# Altium schematic symbol library SparkFun-Aesthetics.SCHLIB: 129 symbols
Pins are listed as number, name and electrical type; pins without a type are passive.

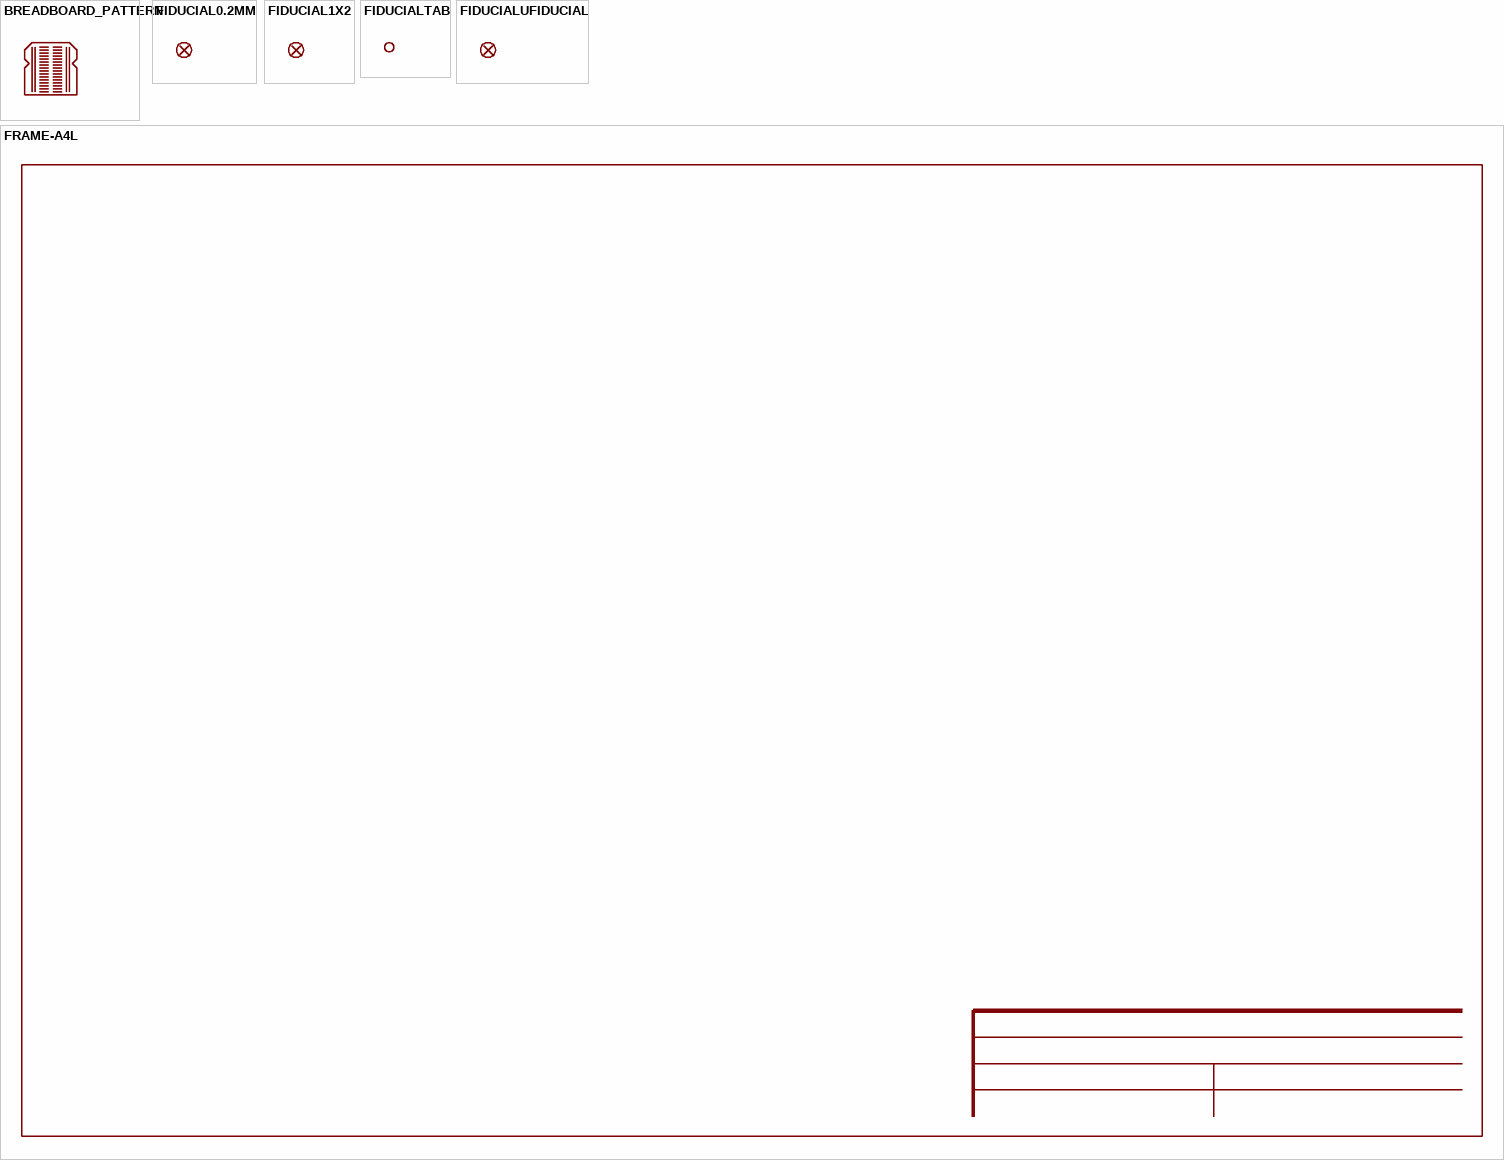
[diagram p0: symbols BREADBOARD_PATTERN to FRAME-A4L]

## BREADBOARD_PATTERN
designator LOGO?, comment Breadboard-Spacing Reference    tDoc reference markings that correspond to solderless breadboard row spacing. Includes power rails and void space between rows.  (value not drawn)
GateName_1: G$1; SymbolName_1: BREADBOARD_ROWS; DeviceSetName: BREADBOARD_PATTERN; LibraryName: SparkFun-Aesthetics; Package: BREADBOARD_SPACING
footprint BREADBOARD_SPACING

## FIDUCIAL0.2MM
designator FD?, comment Fiducial Alignment Points    Point-of-reference for pick-and-place machines and other optical instruments.  (value not drawn)
GateName_1: G$1; DeviceName: 0.2MM; SymbolName_1: FIDUCIAL; LibraryName: SparkFun-Aesthetics; DeviceSetName: FIDUCIAL; Package: FIDUCIAL-0.2MM
footprint FIDUCIAL-0.2MM

## FIDUCIAL1X2
designator FD?, comment Fiducial Alignment Points    Point-of-reference for pick-and-place machines and other optical instruments.  (value not drawn)
GateName_1: G$1; DeviceName: 1X2; SymbolName_1: FIDUCIAL; LibraryName: SparkFun-Aesthetics; DeviceSetName: FIDUCIAL; Package: FIDUCIAL-1X2
footprint FIDUCIAL-1X2

## FIDUCIALTAB
designator FD?, comment Fiducial Panel Tab    This is half of a tab, with fiducial reference mark, used to connect individual boards in a panel of PCBs.   Two of these half tabs, rotated in opposite directions, can be connected together to form a full tab, with two fiducial markings. Place along the edge of a panel of PCBs, this will allow for panels with boards not connected by v-scores, which allows for easier depanelization where there are overhanging components. It can also be used for designs too small to accomodate fiducial marks on individual boards.  (value not drawn)
GateName_1: G$1; SymbolName_1: FIDUCIALTAB; LibraryName: SparkFun-Aesthetics; DeviceSetName: FIDUCIALTAB; Package: FIDUCIALTAB
footprint FIDUCIALTAB

## FIDUCIALUFIDUCIAL
designator FD?, comment Fiducial Alignment Points    Point-of-reference for pick-and-place machines and other optical instruments.  (value not drawn)
GateName_1: G$1; DeviceName: UFIDUCIAL; SymbolName_1: FIDUCIAL; LibraryName: SparkFun-Aesthetics; DeviceSetName: FIDUCIAL; Package: FIDUCIAL-MICRO
footprint FIDUCIAL-MICRO

## FIO_LOGOV2
designator LOGO?, comment Funnel IO (FIO) Logo - Silkscreen    Used on the Arduino Fio.   Devices using:  FIO_LOGO  (value not drawn)
GateName_1: G$1; DeviceName: V2; SymbolName_1: FIO_LOGO; LibraryName: SparkFun-Aesthetics; DeviceSetName: FIO_LOGO; Package: FIO_LOGO
footprint FIO_LOGO

## FOUR_LAYER_WARNING
designator LOGO?, comment Four-Layer Board Warning - tDoc Layer    Warning text which will appear on both the schematic and the board file, notifying viewers that the design is a four-layer PCB.  (value not drawn)
GateName_1: G$1; SymbolName_1: FOUR_LAYER_WARNING; LibraryName: SparkFun-Aesthetics; DeviceSetName: FOUR_LAYER_WARNING; Package: FOUR_LAYER_WARNING
footprint FOUR_LAYER_WARNING

## FRAME-A4L
designator FRAME?, comment Schematic Frame - A4L - European Format    Standard A4 size frame in Landscape  (value not drawn)
GateName_1: G$1; SymbolName_1: FR-A4L; LibraryName: SparkFun-Aesthetics; DeviceSetName: FRAME-A4L

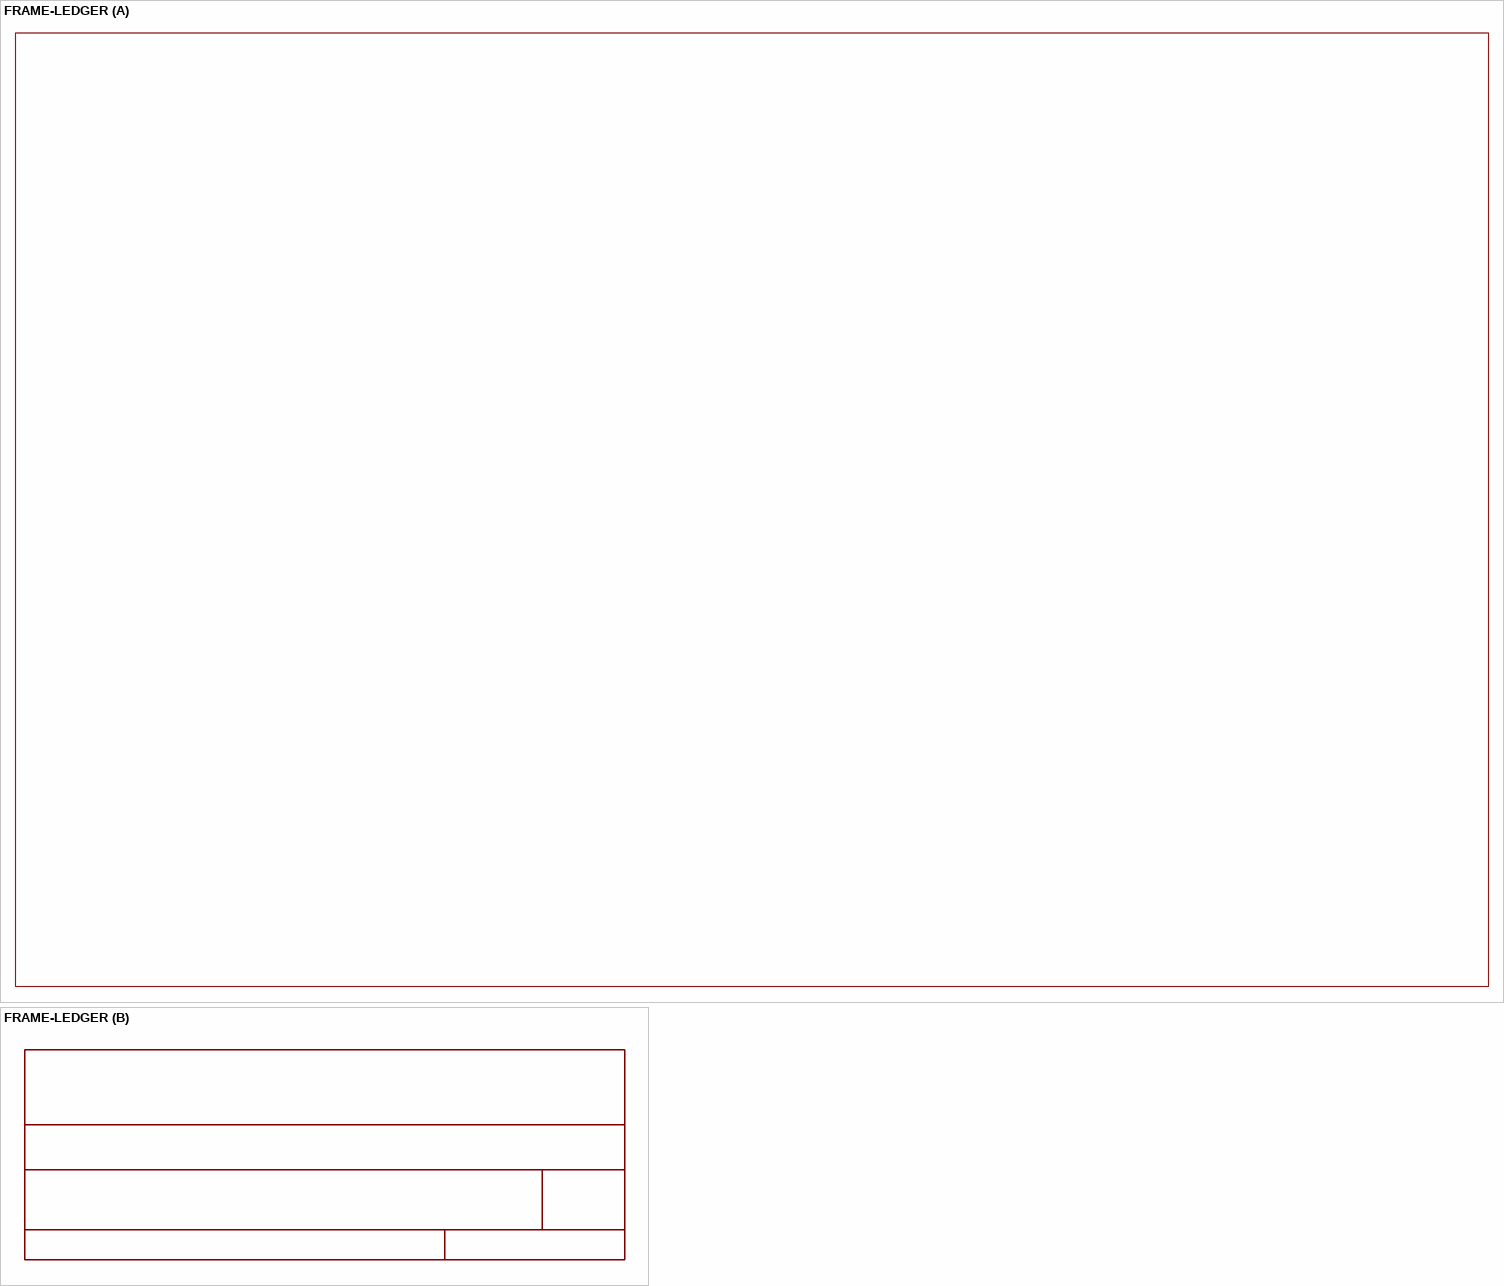
[diagram p1: symbol FRAME-LEDGER]

## FRAME-LEDGER
designator FRAME?, comment Schematic Frame - Ledger    Standard 11x14 US Ledger frame  (value not drawn)
GateName_1: G$1; SymbolName_1: FRAME_LEDGER; GateName_2: G$2; SymbolName_2: DOCFIELD; LibraryName: SparkFun-Aesthetics; DeviceSetName: FRAME-LEDGER; Package: CREATIVE_COMMONS
footprint CREATIVE_COMMONS

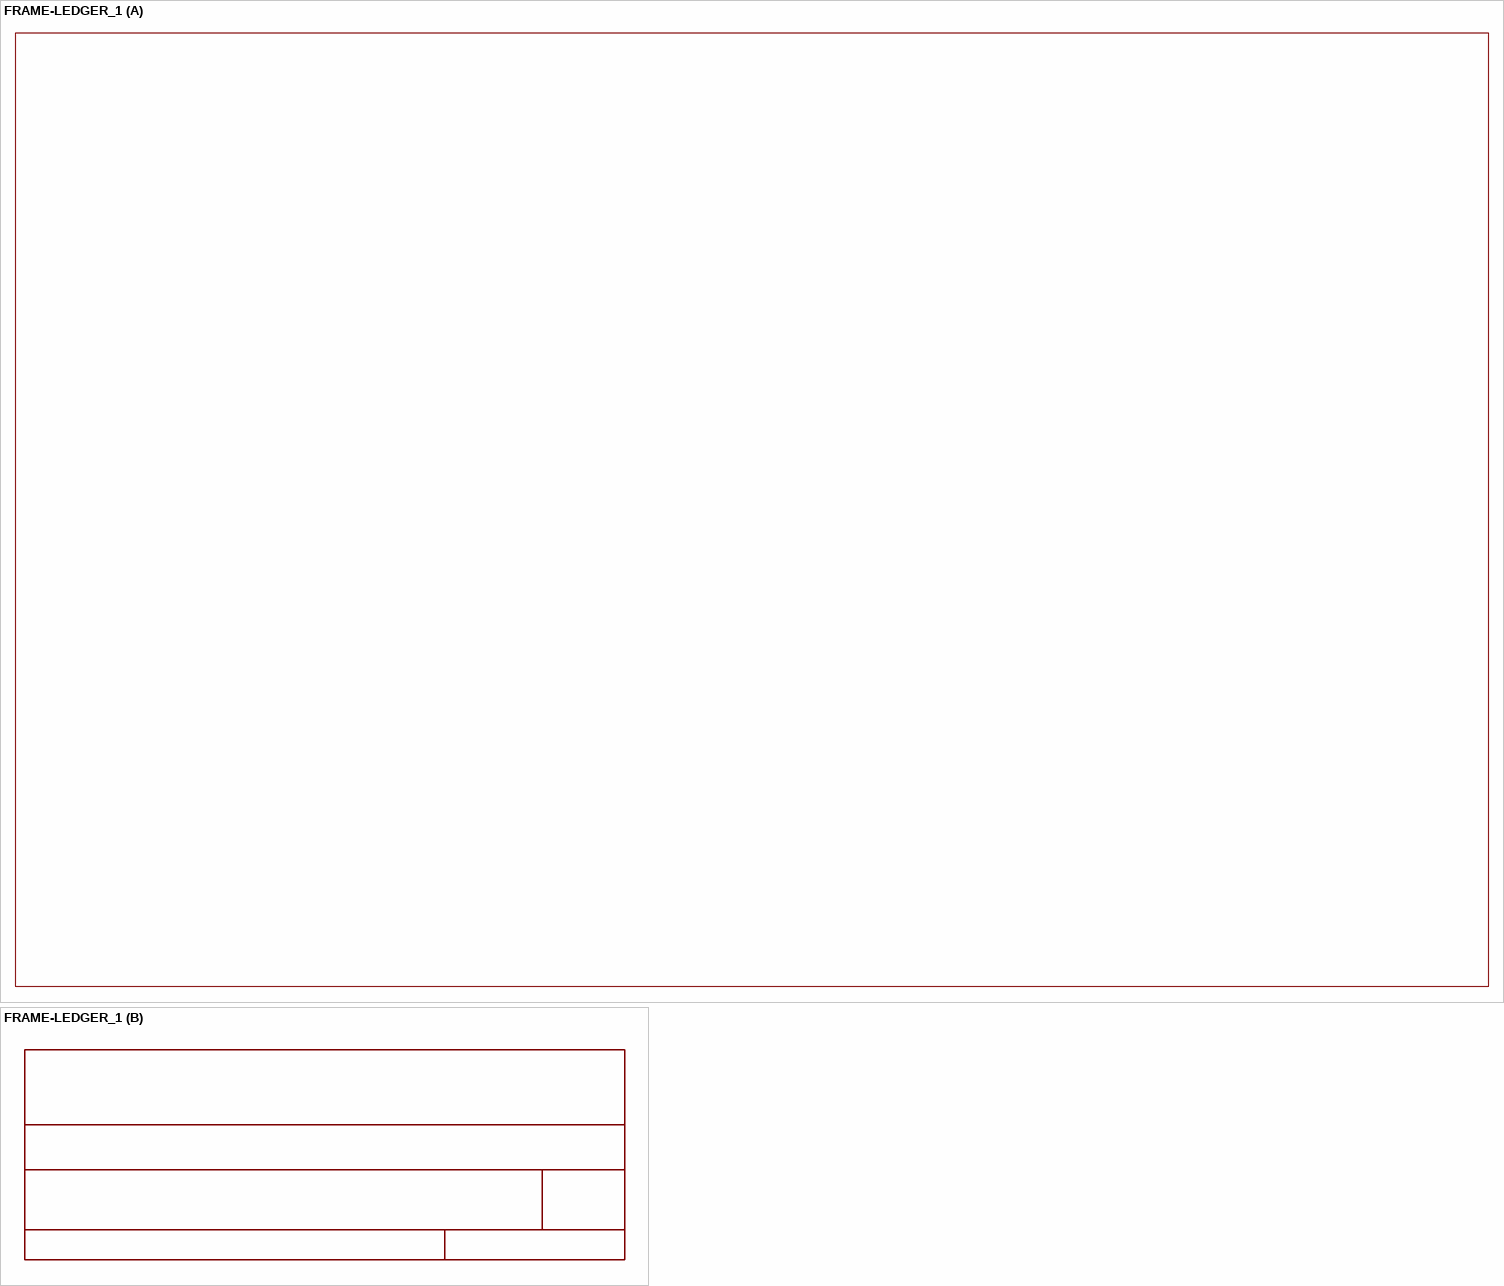
[diagram p2: symbol FRAME-LEDGER_1]

## FRAME-LEDGER_1
designator FRAME?, comment Schematic Frame - Ledger    Standard 11x14 US Ledger frame  (value not drawn)
GateName_1: G$1; SymbolName_1: FRAME_LEDGER; GateName_2: G$2; SymbolName_2: DOCFIELD; LibraryName: SparkFun-Aesthetics; DeviceSetName: FRAME-LEDGER; Package: CREATIVE_COMMONS
footprint CREATIVE_COMMONS

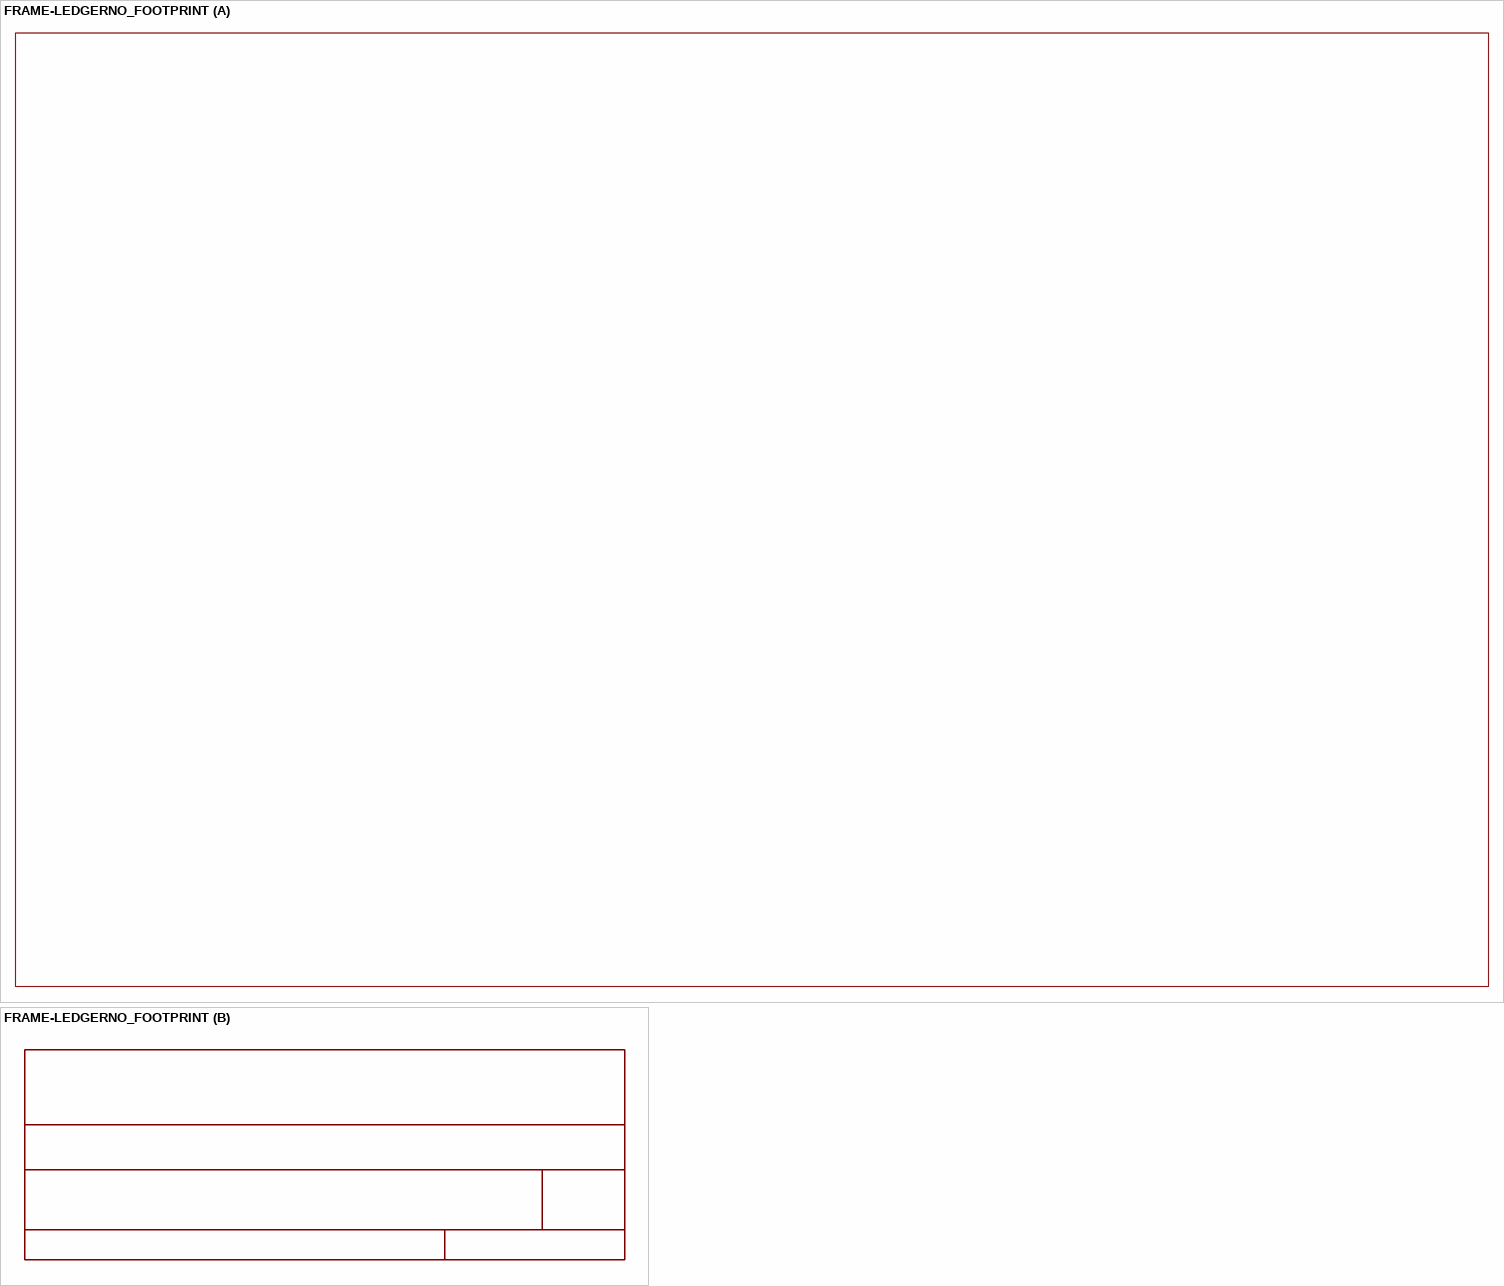
[diagram p3: symbol FRAME-LEDGERNO_FOOTPRINT]

## FRAME-LEDGERNO_FOOTPRINT
designator FRAME?, comment Schematic Frame - Ledger    Standard 11x14 US Ledger frame  (value not drawn)
GateName_1: G$1; SymbolName_1: FRAME_LEDGER; GateName_2: G$2; SymbolName_2: DOCFIELD; DeviceName: NO_FOOTPRINT; LibraryName: SparkFun-Aesthetics; DeviceSetName: FRAME-LEDGER; Package: DUMMY
footprint DUMMY

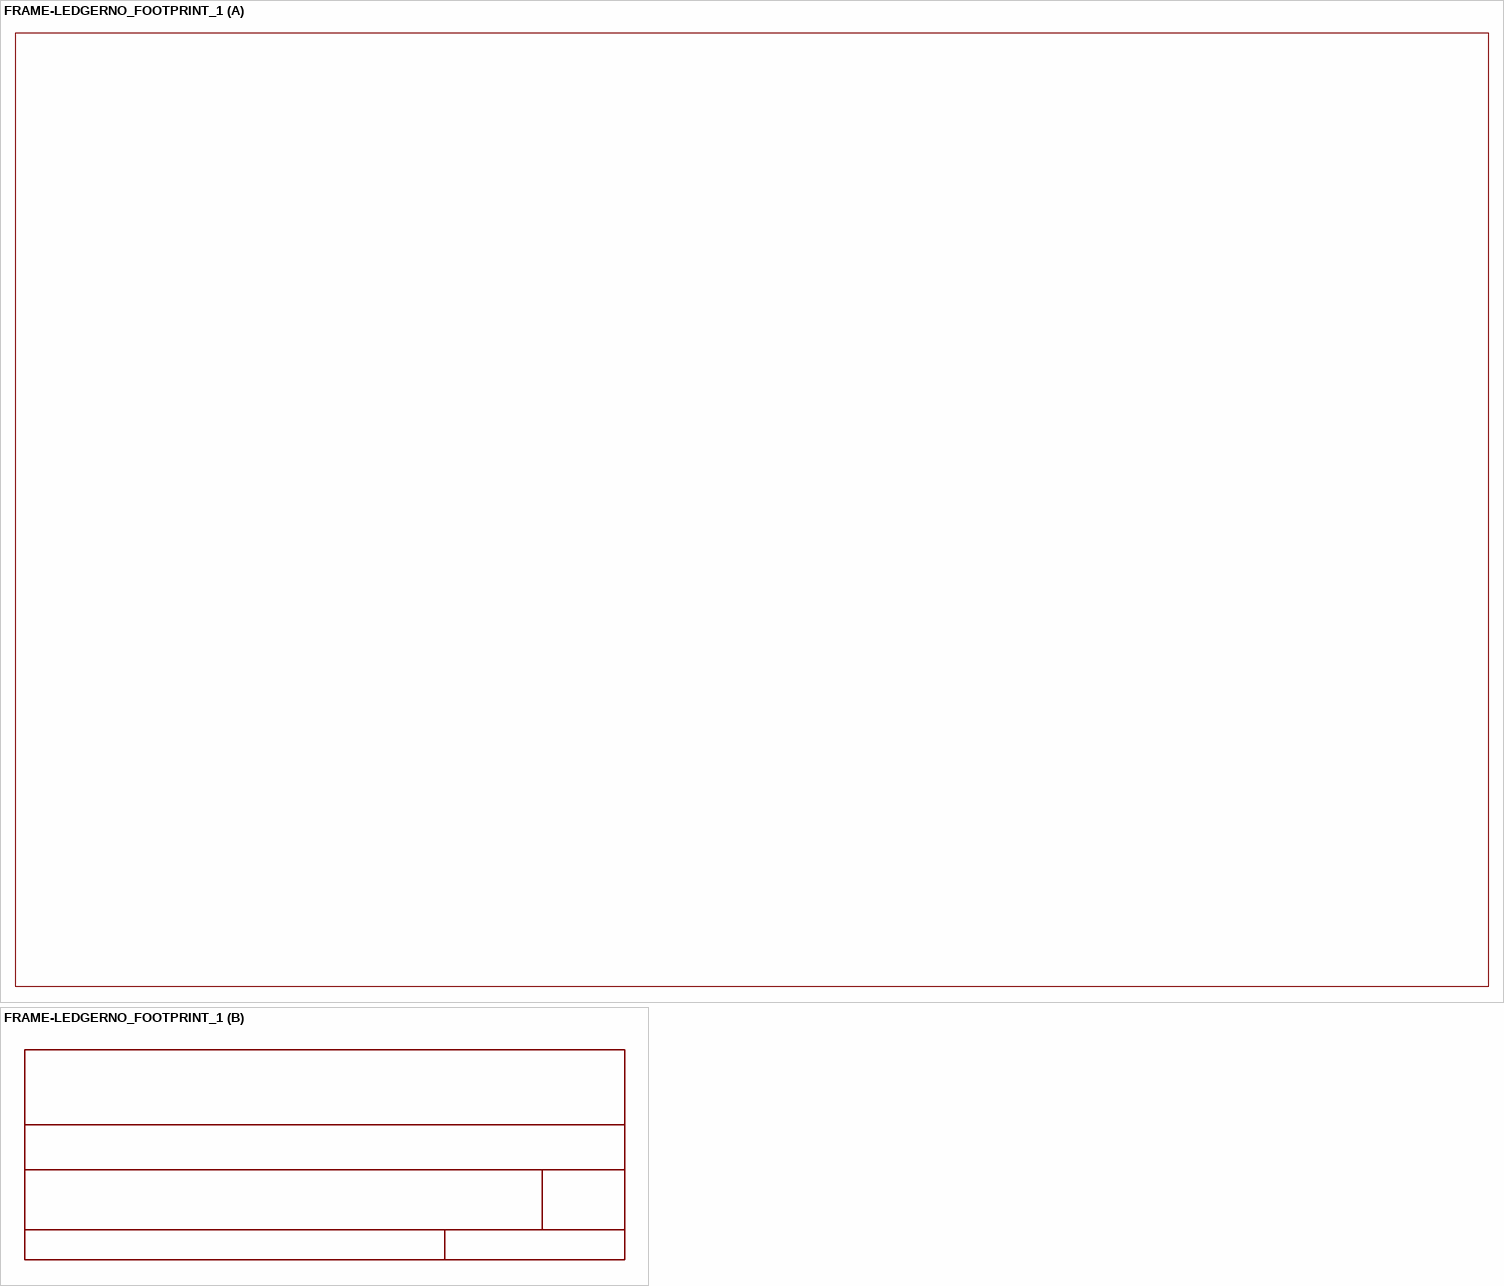
[diagram p4: symbol FRAME-LEDGERNO_FOOTPRINT_1]

## FRAME-LEDGERNO_FOOTPRINT_1
designator FRAME?, comment Schematic Frame - Ledger    Standard 11x14 US Ledger frame  (value not drawn)
GateName_1: G$1; SymbolName_1: FRAME_LEDGER; GateName_2: G$2; SymbolName_2: DOCFIELD; DeviceName: NO_FOOTPRINT; LibraryName: SparkFun-Aesthetics; DeviceSetName: FRAME-LEDGER; Package: DUMMY
footprint DUMMY

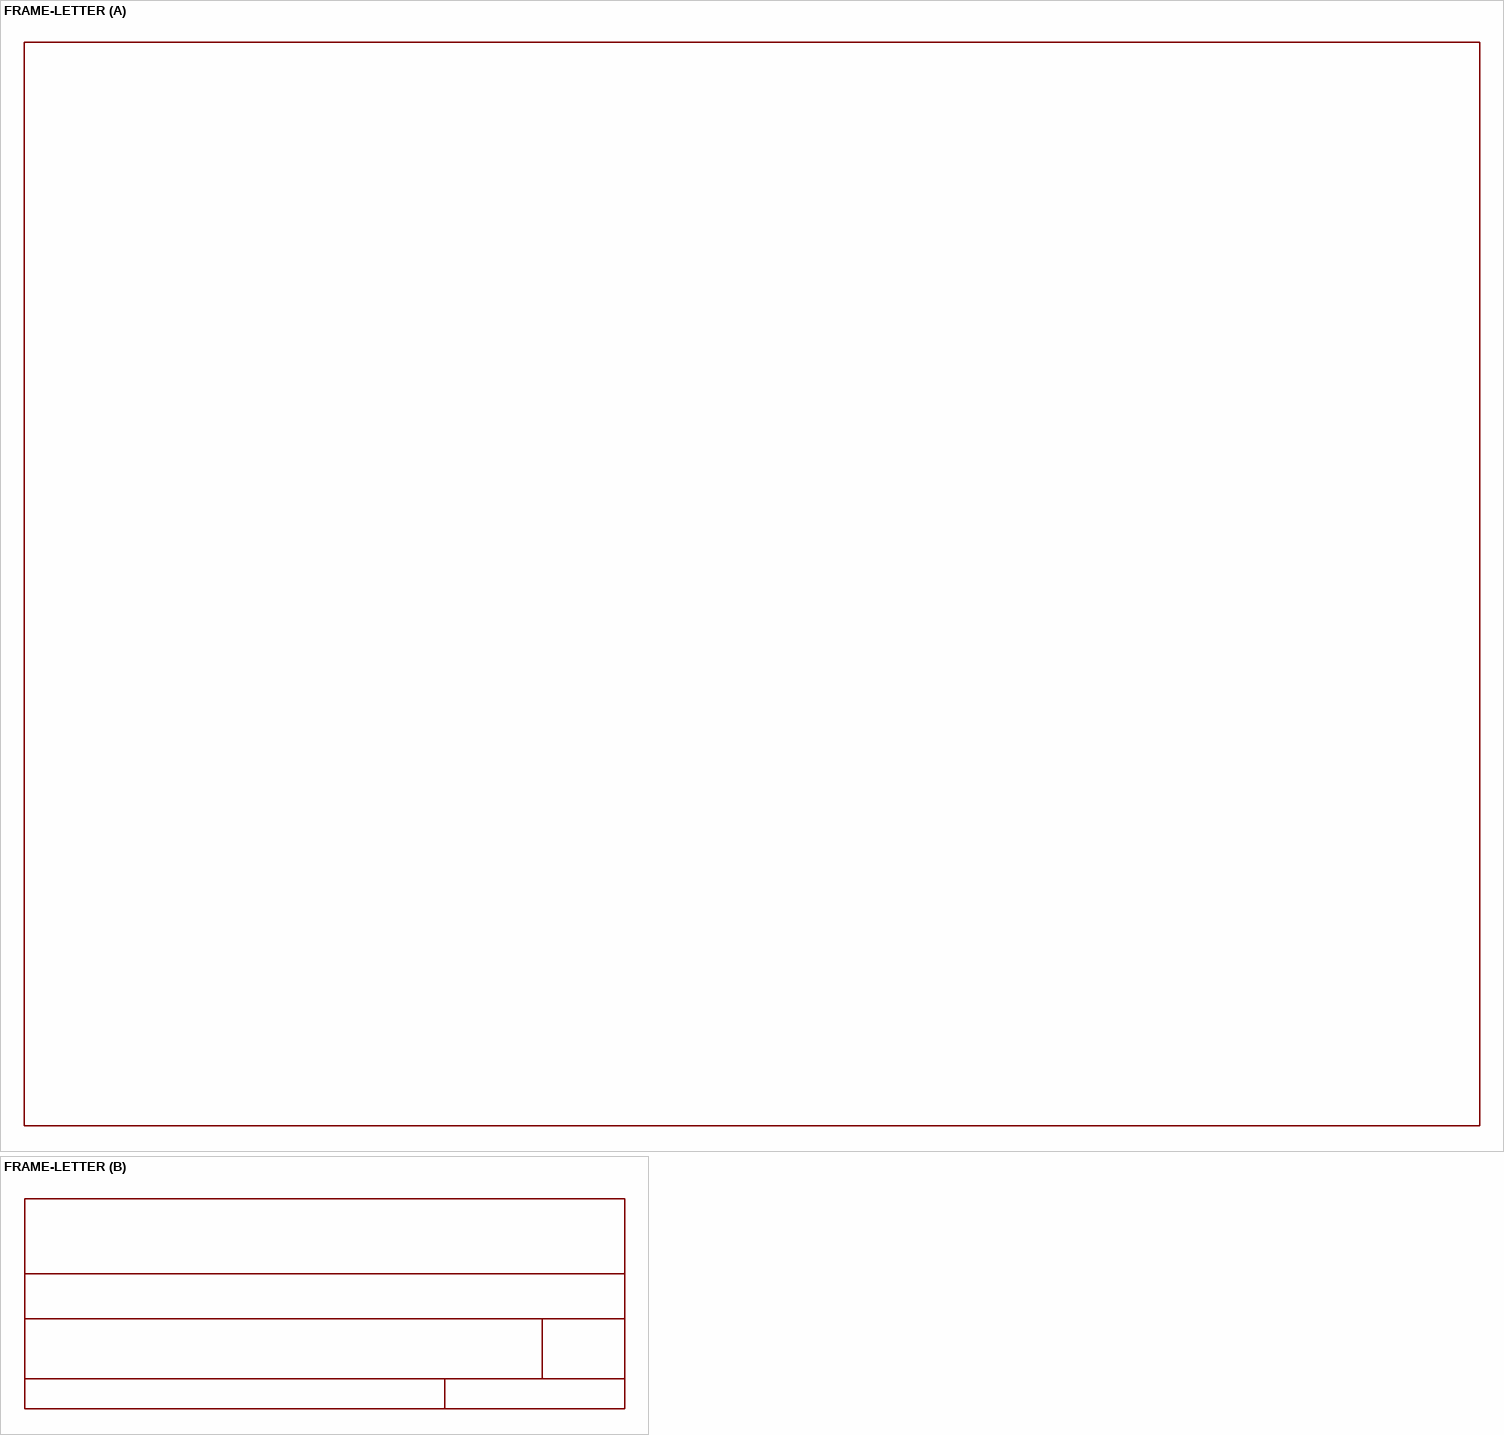
[diagram p5: symbol FRAME-LETTER]

## FRAME-LETTER
designator FRAME?, comment Schematic Frame - Letter    Standard 8.5x11 US Letter frame  (value not drawn)
GateName_1: G$1; GateName_2: V; SymbolName_2: DOCFIELD; SymbolName_1: FRAME-LETTER; LibraryName: SparkFun-Aesthetics; DeviceSetName: FRAME-LETTER; Package: CREATIVE_COMMONS
footprint CREATIVE_COMMONS

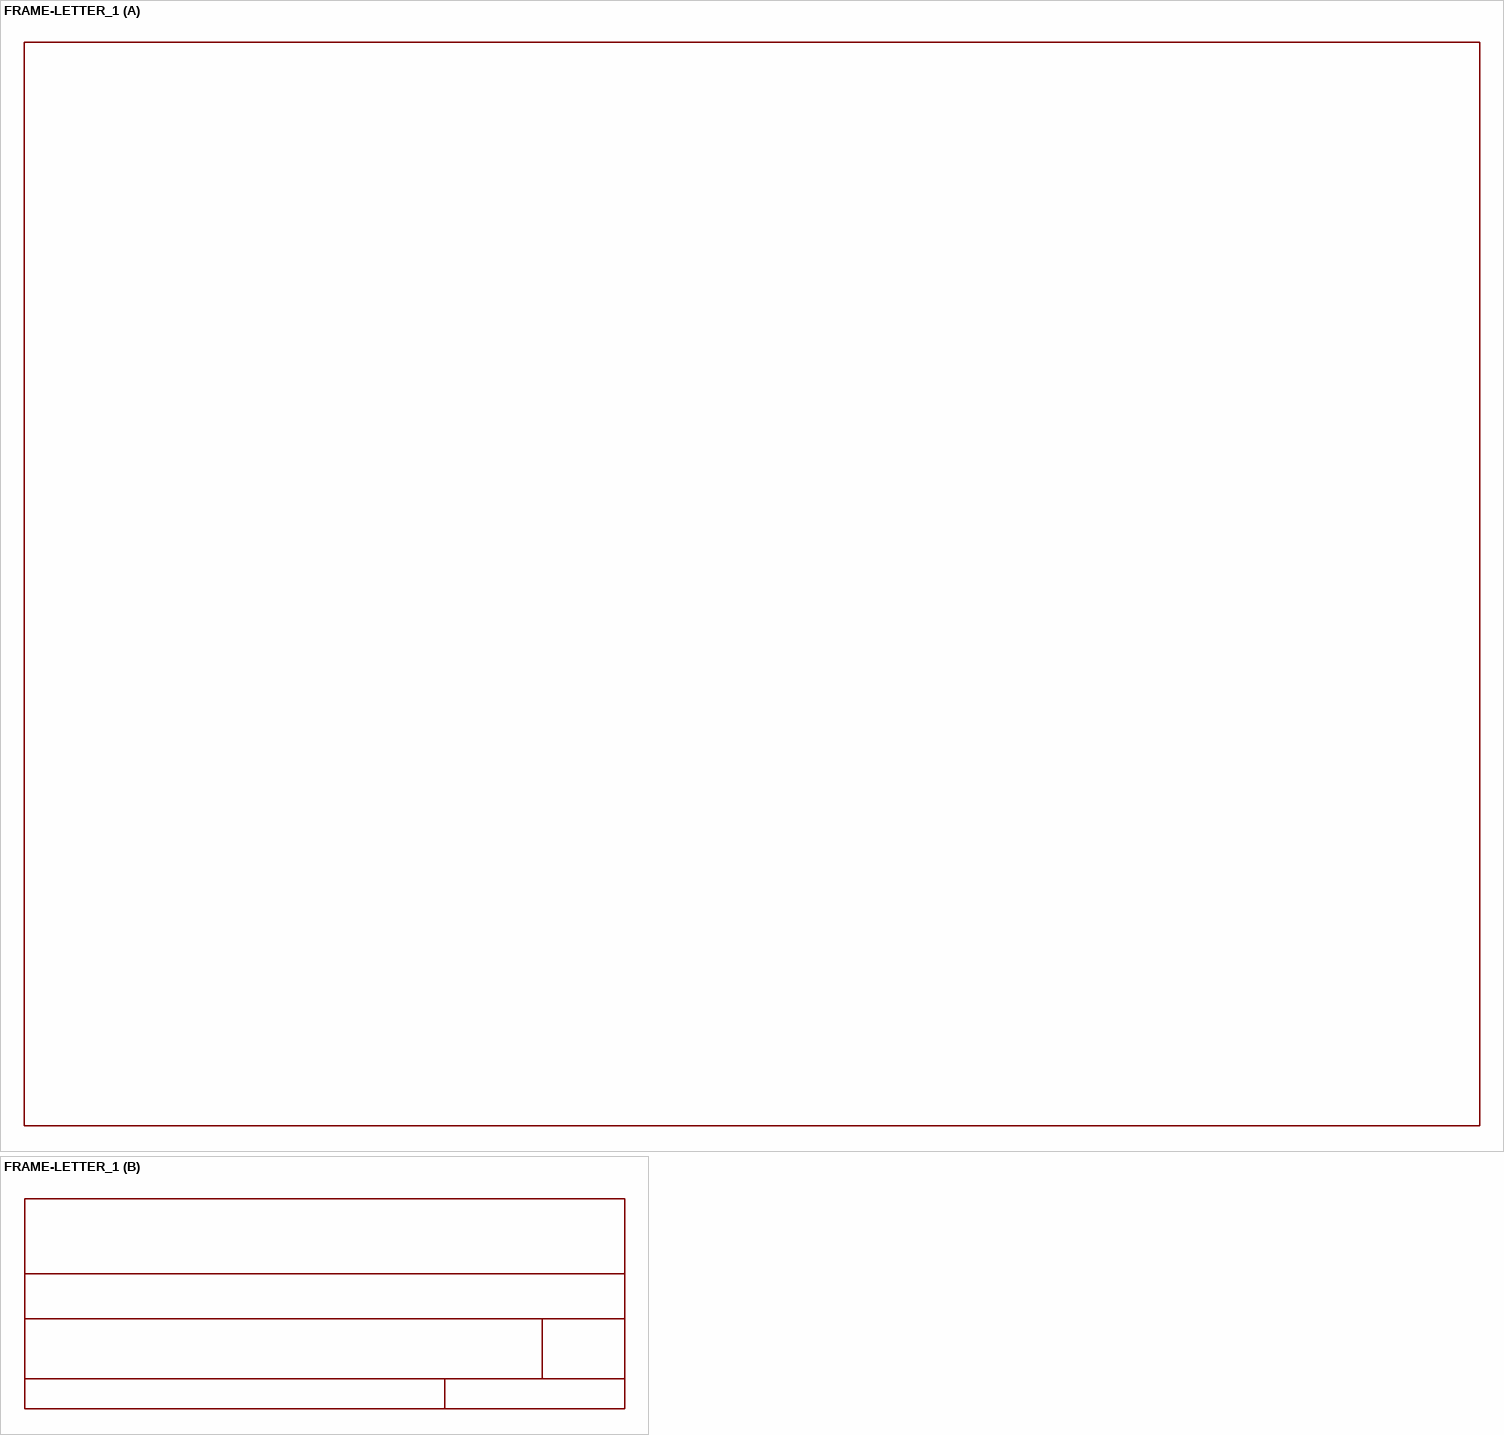
[diagram p6: symbol FRAME-LETTER_1]

## FRAME-LETTER_1
designator FRAME?, comment Schematic Frame - Letter    Standard 8.5x11 US Letter frame  (value not drawn)
GateName_1: G$1; GateName_2: V; SymbolName_2: DOCFIELD; SymbolName_1: FRAME-LETTER; LibraryName: SparkFun-Aesthetics; DeviceSetName: FRAME-LETTER; Package: CREATIVE_COMMONS
footprint CREATIVE_COMMONS

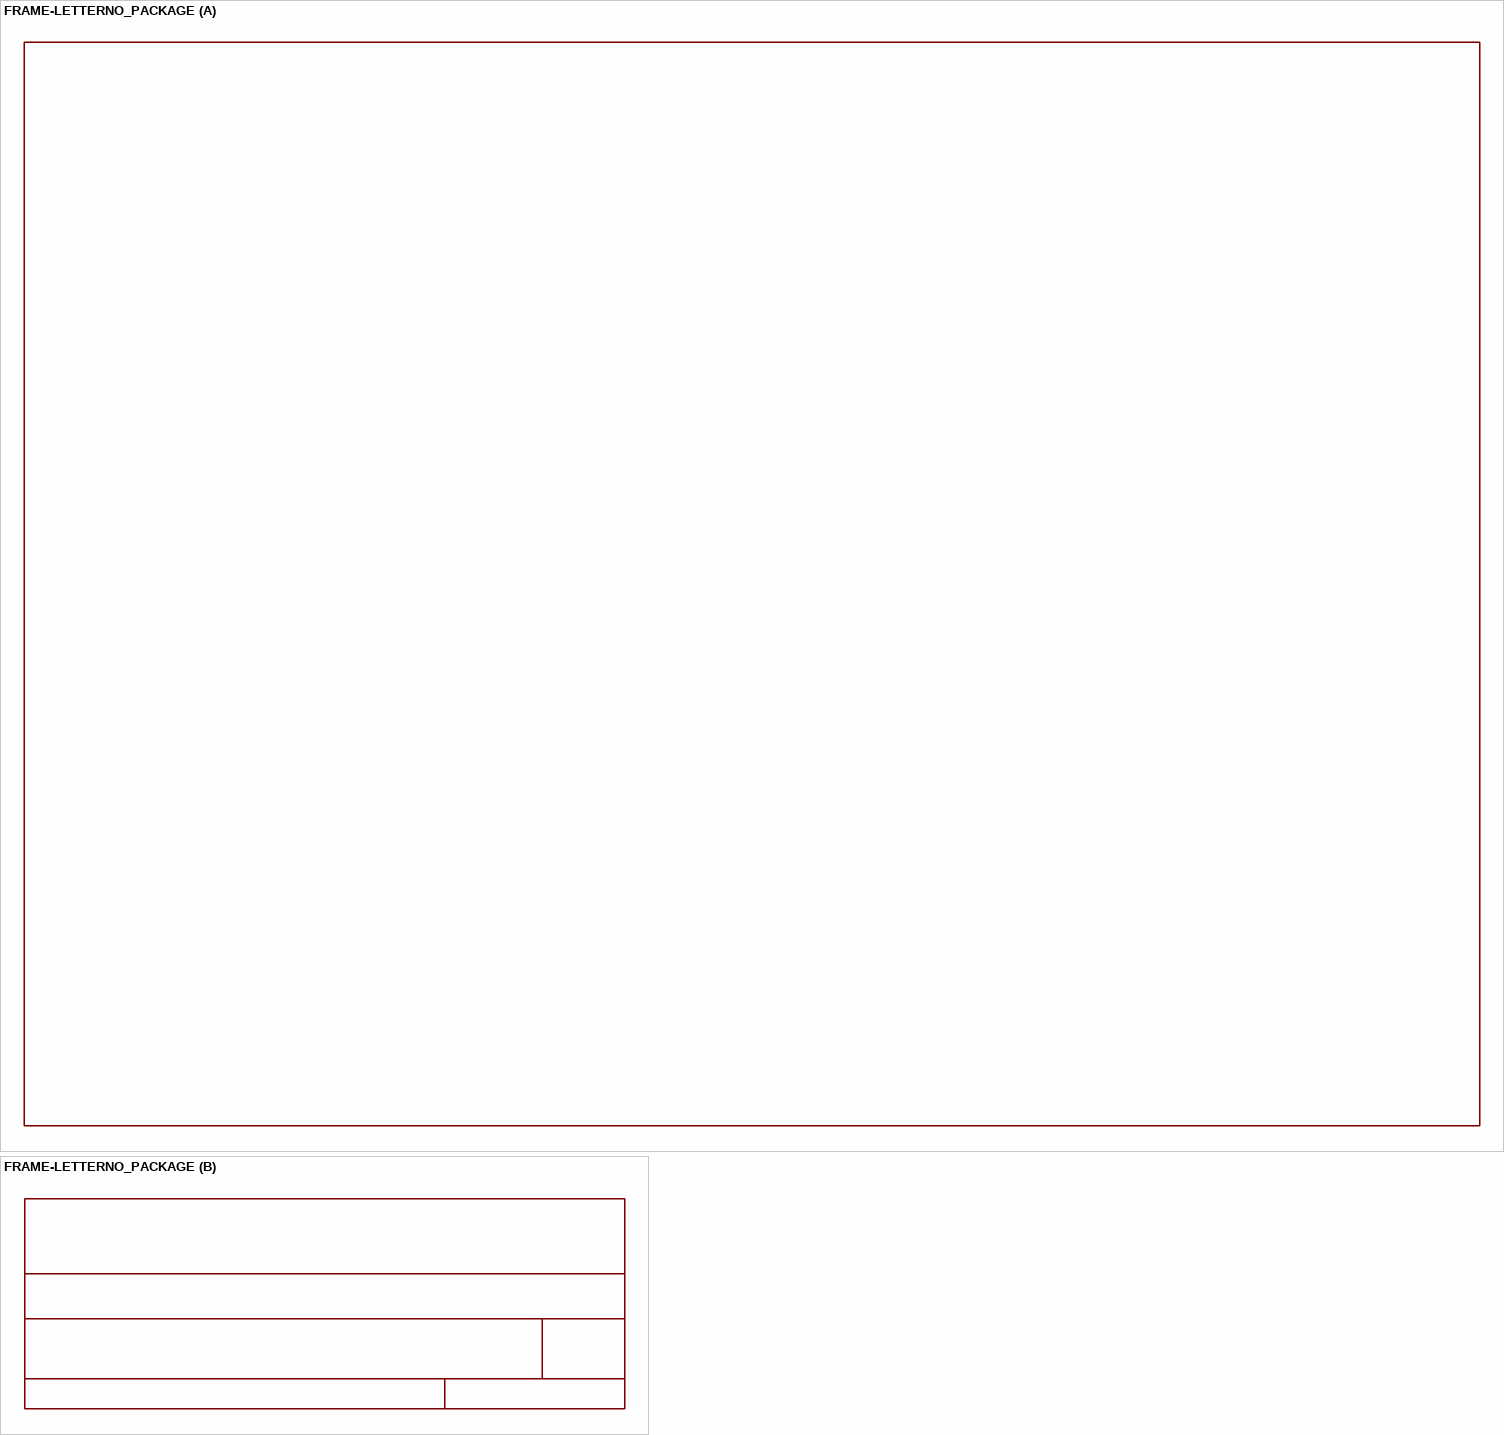
[diagram p7: symbol FRAME-LETTERNO_PACKAGE]

## FRAME-LETTERNO_PACKAGE
designator FRAME?, comment Schematic Frame - Letter    Standard 8.5x11 US Letter frame  (value not drawn)
GateName_1: G$1; GateName_2: V; SymbolName_2: DOCFIELD; DeviceName: NO_PACKAGE; DESIGNER: Nobody; SymbolName_1: FRAME-LETTER; LibraryName: SparkFun-Aesthetics; DeviceSetName: FRAME-LETTER; Package: DUMMY; VERSION: v01
footprint DUMMY
